# Altium footprint library Connectors.PcbLib: 114 footprints (part 8 of 8)
Each footprint in its own frame and in the unit in brackets; x right, y up, seen from the top. Pads: shape width x height; smd on the part's side, far side on the other; paste and mask are expansions set on the pad; w line width, h text height; cw(c..) or ccw(c..) is an arc to the next point about the centre after c.
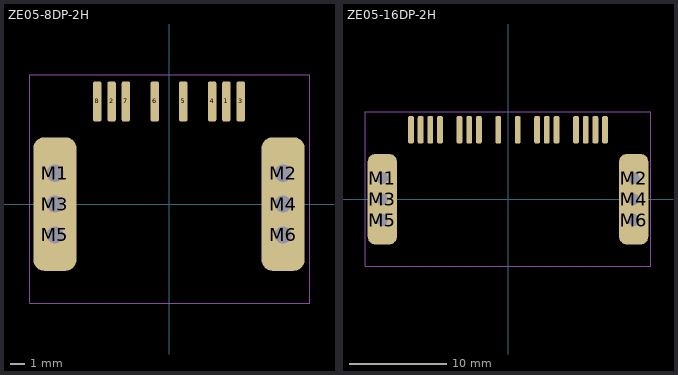
[diagram p7: the footprints below, top view; thin cyan lines are the x and y axes]

## ZE05-8DP-2H [mm]
height 8.34
pads (14):
  rrect50% 0.6x2.8 smd: 1(4,7.15) 2(-4,7.15) 3(5,7.15) 4(3,7.15) 5(1,7.15) 6(-1,7.15) 7(-3,7.15) 8(-5,7.15)
  rrect50% 3x5 hole 1.2: M1(-7.95,2.15) M2(7.95,2.15) M3(-7.95,0) M4(7.95,0) M5(-7.95,-2.15) M6(7.95,-2.15)
Mechanical 15:
  lines w0.05: -9.7,-6.9 9.8,-6.9 9.8,9 -9.7,9 -9.7,-6.9
3D body "õqÉŠŒpZE05-8DP-2H.stp": height 8.84, standoff -2.1, extent -9.26,-6.6 9.26,8.2

## ZE05-16DP-2H [mm]
height 8.34
pads (22):
  rrect50% 0.6x2.8 smd: 1(10,7.15) 2(8,7.15) 3(4,7.15) 4(-4,7.15) 5(-8,7.15) 6(-10,7.15) 7(9,7.15) 8(7,7.15) 9(5,7.15) 10(3,7.15) 11(1,7.15) 12(-1,7.15) 13(-3,7.15) 14(-5,7.15) 15(-7,7.15) 16(-9,7.15)
  rrect50% 3x5 hole 1.2: M1(-12.95,2.15) M2(12.95,2.15) M3(-12.95,0) M4(12.95,0) M5(-12.95,-2.15) M6(12.95,-2.15)
Mechanical 15:
  lines w0.05: -14.7,-6.9 -14.7,9 14.7,9 14.7,-6.9 -14.7,-6.9
3D body "ZE05-16DP-2H.stp": height 8.89, standoff -2.05, extent -14.26,-6.5 14.26,8.3